# Altium footprint library Connector.PcbLib: 114 footprints (part 1 of 8)
Each footprint in its own frame and in the unit in brackets; x right, y up, seen from the top. Pads: shape width x height; smd on the part's side, far side on the other; paste and mask are expansions set on the pad; w line width, h text height; cw(c..) or ccw(c..) is an arc to the next point about the centre after c.
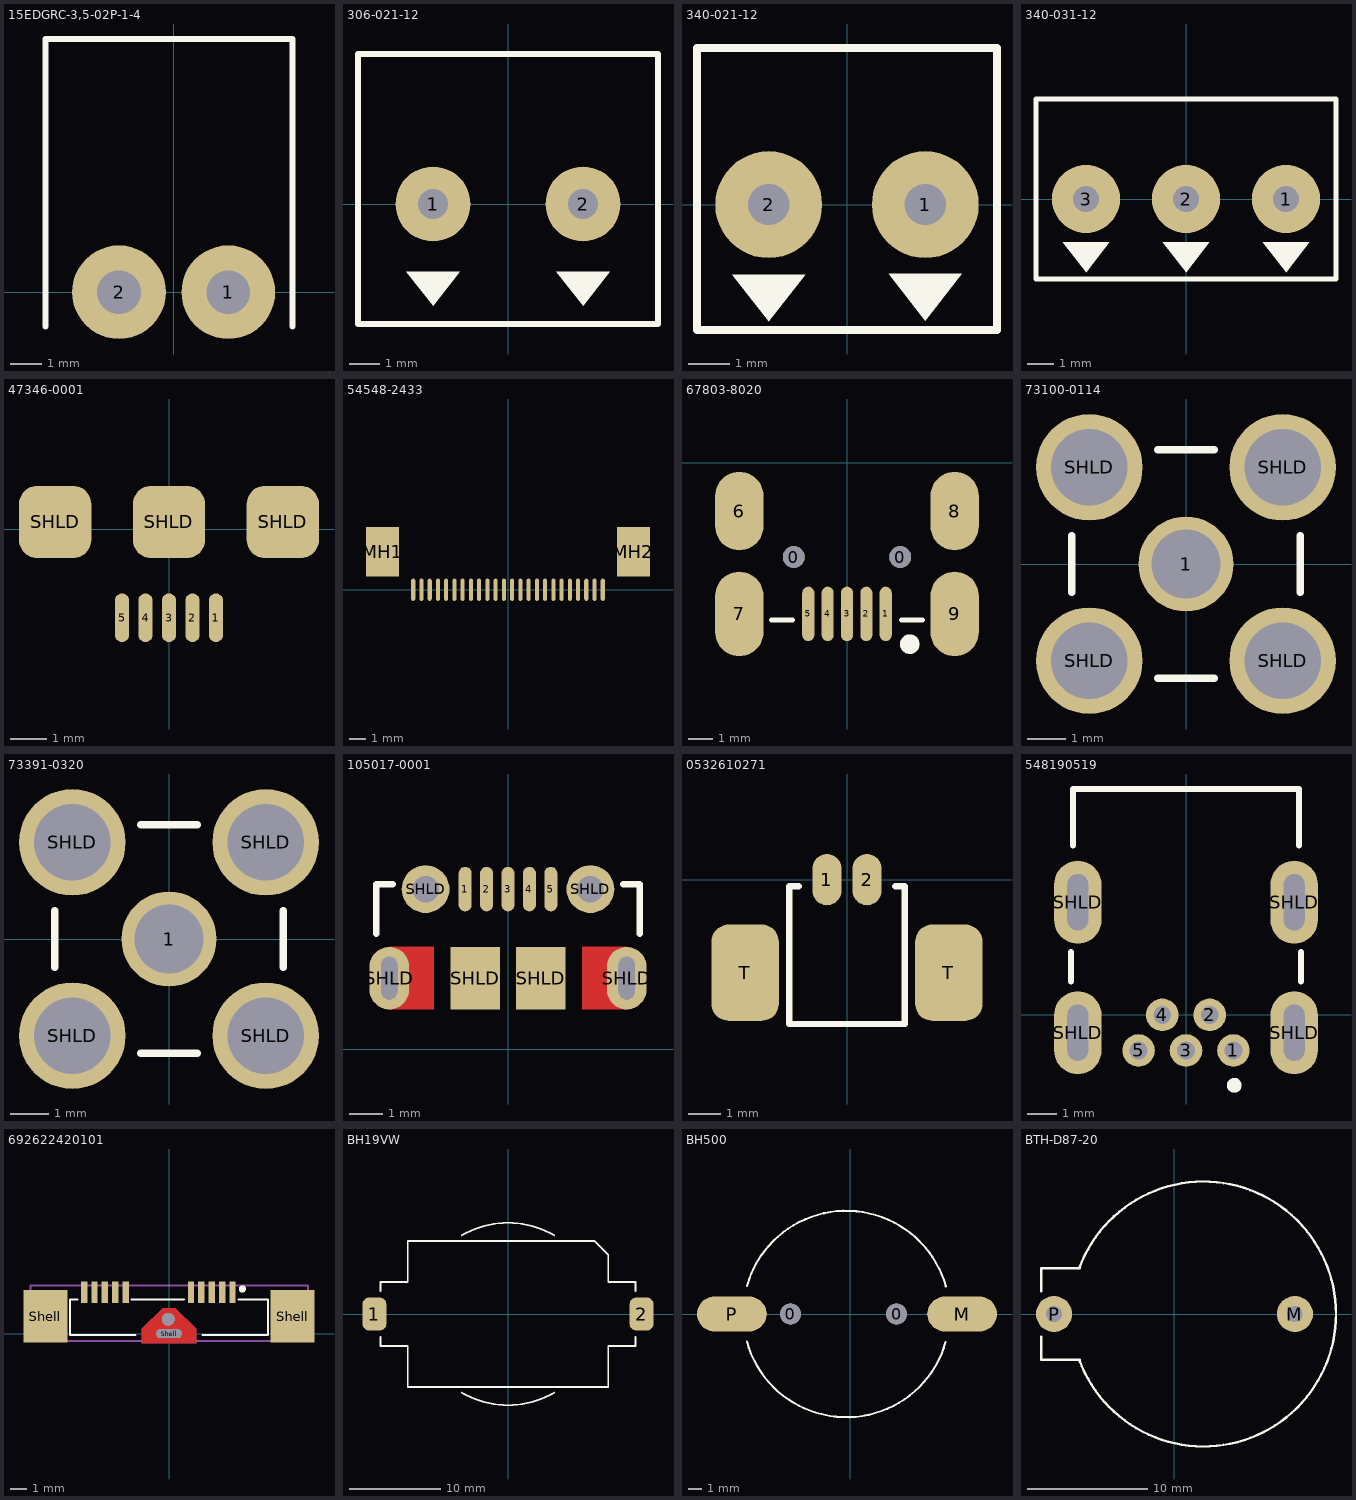
[diagram p0: the footprints below, top view; thin cyan lines are the x and y axes]

## 15EDGRC-3,5-02P-1-4 [mm]
pads (2):
  round 3 hole 1.4: 1(1.75,0) 2(-1.75,0)
Top Overlay:
  lines w0.2: -4.1,-1.1 -4.1,8.1 3.8,8.1 3.8,-1.1
3D body "15EDGRC-3_5-2.STEP": height 7.22, standoff -3.38, extent -3.9,-1.2 3.9,8

## 306-021-12 [mm]
pads (2):
  round 2.5 hole 1 unplated: 1(-2.5,0) 2(2.5,0)
Top Overlay:
  region: 3.389,-2.25 1.611,-2.25 2.5,-3.393
  region: -1.611,-2.25 -3.389,-2.25 -2.5,-3.393
  lines w0.2: -5,-4 5,-4 5,5 -5,5 -5,-4
3D body "DG300-5_0-02P-12.STEP": height 12.62, standoff -4.38, extent -5,-4 5,5

## 340-021-12 [mm]
pads (2):
  round 2.6 hole 1: 1(1.905,0) 2(-1.905,0)
Top Overlay:
  region: 2.795,-1.679 1.017,-1.679 1.906,-2.822
  region: -1.011,-1.7 -2.789,-1.7 -1.9,-2.843
  lines w0.2: -3.65,-3.048 -3.65,3.81 3.65,3.81 3.65,-3.048 -3.65,-3.048
3D body "DG340.STEP": height 8.51, standoff -3.49, extent -3.55,-3.1 3.55,3.9

## 340-031-12 [mm]
pads (3):
  round 2.6 hole 1: 1(3.81,0) 2(0,0) 3(-3.81,0)
Top Overlay:
  region: -2.921,-1.651 -4.699,-1.651 -3.81,-2.794
  region: 0.889,-1.651 -0.889,-1.651 0,-2.794
  region: 4.699,-1.651 2.921,-1.651 3.81,-2.794
  lines w0.2: -5.715,-3.048 5.715,-3.048 5.715,3.81 -5.715,3.81 -5.715,-3.048
3D body "DG340-031-12.STEP": height 8.52, standoff -3.48, extent -5.715,-3.1 5.715,3.9

## 47346-0001 [mm]
pads (8):
  oval 0.4x1.35 smd: 1(1.3,-2.45) 2(0.65,-2.45) 3(0,-2.45) 4(-0.65,-2.45) 5(-1.3,-2.45)
  rrect50% 2x2 smd: SHLD(-3.15,0.2) SHLD(0,0.2) SHLD(3.15,0.2)
Top Solder:
  rectangle: -1.3,-3 1.3,-1.9
3D body "473460001.stp": height 2.71, standoff -0.23, extent -3.99,-2.65 3.99,2.78

## 54548-2433 [mm]
pads (26):
  oval 0.25x1.35 smd: 1(-5.75,0) 2(-5.25,0) 3(-4.75,0) 4(-4.25,0) 5(-3.75,0) 6(-3.25,0) 7(-2.75,0) 8(-2.25,0) 9(-1.75,0) 10(-1.25,0) 11(-0.75,0) 12(-0.25,0) 13(0.25,0) 14(0.75,0) 15(1.25,0) 16(1.75,0) 17(2.25,0) 18(2.75,0) 19(3.25,0) 20(3.75,0) 21(4.25,0) 22(4.75,0) 23(5.25,0) 24(5.75,0)
  rect 2x3 smd: MH1(-7.6,2.3) MH2(7.6,2.3)
3D body "545482433.stp": height 1.21, standoff 0.01, extent -8.6,-0.05 8.6,4.95

## 67803-8020 [mm]
pads (11):
  round 0.9 hole 0.9 unplated: 0(-2.2,-3.9) 0(2.2,-3.9)
  oval 0.5x2.25 smd: 1(1.6,-6.25) 2(0.8,-6.25) 3(0,-6.25) 4(-0.8,-6.25) 5(-1.6,-6.25)
  oval 2x3.25 smd: 6(-4.45,-2) 8(4.45,-2)
  oval 2x3.5 smd: 7(-4.45,-6.25) 9(4.45,-6.25)
Top Overlay:
  circle w0.254: c2.595,-7.5 r0.28
  region: 2.625,-7.25 2.875,-7.5 2.625,-7.75 2.375,-7.5
  lines w0.2: -3.125,-6.5 -2.25,-6.5 ; 2.25,-6.5 3.125,-6.5
3D body "678038020.stp": height 4.02, standoff -0.93, extent -4.95,-7 4.95,2

## 73100-0114 [mm] "Connector; RF Coaxial, MCX, Thru-Hole; 5 Position; Right-Angle"
height 5.85
pads (5):
  round 2.5 hole 1.8: 1(0,0)
  round 2.8 hole 2: SHLD(-2.54,-2.54) SHLD(-2.54,2.54) SHLD(2.54,-2.54) SHLD(2.54,2.54)
Top Overlay:
  lines w0.2: -3,-0.74 -3,0.74 ; -0.74,-3 0.74,-3 ; -0.74,3 0.74,3 ; 3,-0.74 3,0.74
3D body "SMA-angled.STEP": height 9.91, standoff -3.89, extent -11,-3.5 3.5,3.5

## 73391-0320 [mm]
pads (5):
  round 2.5 hole 1.8: 1(0,0)
  round 2.8 hole 2: SHLD(-2.54,-2.54) SHLD(-2.54,2.54) SHLD(2.54,-2.54) SHLD(2.54,2.54)
Top Overlay:
  lines w0.2: -3,-0.74 -3,0.74 ; -0.74,-3 0.74,-3 ; -0.74,3 0.74,3 ; 3,-0.74 3,0.74
3D body "8006.stp": height 8.58, standoff -3.99, extent -11.8,-3.165 3.15,3.165

## 105017-0001 [mm] "105017-0001 Micro USB Connector (Molex)"
height 2
pads (11):
  oval 0.4x1.35 smd: 1(-1.3,4.85) 2(-0.65,4.85) 3(0,4.85) 4(0.65,4.85) 5(1.3,4.85)
  oval 1.2x1.9 hole 0.5 slot 1.3 at 90 deg: SHLD(-3.6,2.15) SHLD(3.6,2.15)
  round 1.45 hole 0.8: SHLD(-2.5,4.85) SHLD(2.5,4.85)
  rect 1.5x1.9 smd: SHLD(-1,2.15) SHLD(1,2.15)
Top Layer:
  region: -3.6,3.1 -2.25,3.1 -2.25,1.2 -3.6,1.2
  region: 2.25,3.1 3.6,3.1 3.6,1.2 2.25,1.2
Top Overlay:
  lines w0.2: -4,3.5 -4,5 -3.5,5 ; 3.5,5 4,5 4,3.5
Top Solder:
  rectangle: -1.3,4.3 1.3,5.4
  region: 2.15,3.2 3.6,3.2 3.6,1.1 2.15,1.1
  region: -3.6,3.2 -2.15,3.2 -2.15,1.1 -3.6,1.1
3D body "MicroUSB-B_Molex_105017-0001.STEP": height 2.72, standoff -0.58, extent -4.1,-0.4 4.1,5.03

## 0532610271 [mm]
pads (4):
  oval 0.9x1.6 smd mask+0.1: 1(-0.625,0) 2(0.625,0)
  rrect50% 2.1x3 smd mask+0.1: T(-3.175,-2.9) T(3.175,-2.9)
Top Overlay:
  lines w0.2: -1.5,-0.2 -1.8,-0.2 -1.8,-4.5 1.8,-4.5 1.8,-0.2 1.5,-0.2
3D body "FH02MR-SMT.STEP": height 3.52, standoff 0.02, extent -3.825,-4.8 3.825,0.4

## 548190519 [mm] "Connector; USB Mini-B, Type 2, Thru-Hole; 5 Position; Vertical"
height 7.7
pads (9):
  round 1.1 hole 0.6 mask+0.1: 1(1.6,-1.2) 2(0.8,0) 3(0,-1.2) 4(-0.8,0) 5(-1.6,-1.2)
  oval 1.6x2.8 hole 0.7 slot 1.9 at 90 deg mask+0.1: SHLD(-3.65,-0.6) SHLD(-3.65,3.8) SHLD(3.65,-0.6) SHLD(3.65,3.8)
Top Overlay:
  circle w0.25: c1.625,-2.375 r0.125
  lines w0.2: -3.875,1.125 -3.875,2.125 ; -3.81,5.715 -3.81,7.62 3.81,7.62 3.81,5.715 ; 3.875,1.125 3.875,2.125
3D body "548190519.stp": height 3.96, standoff -1.79, extent -3.85,-1.4 3.85,7.6

## 692622420101 [mm] "Micro Type B Vertical SMT - with Pads & positionning peg"
height 2.45
pads (14):
  rect 0.4x1.35 smd: 1(3.98,2.58) 2(3.33,2.58) 3(2.68,2.58) 4(2.03,2.58) 5(1.38,2.58) 6(-2.72,2.58) 7(-3.37,2.58) 8(-4.02,2.58) 9(-4.67,2.58) 10(-5.32,2.58)
  rect 2.75x3.3 smd: Shell(-7.75,1.08) Shell(7.75,1.08)
  round 0.8 hole 0.8: Shell(-0.05,0.9)
  oval 1.6x0.55 hole 0.55 slot 1.6 at 0 deg paste-99: Shell(0,0)
Top Layer:
  region: -1.7,-0.6 -1.7,0.3 -0.4,1.6 0.4,1.6 1.7,0.3 1.7,-0.6
Bottom Layer:
  region: -1.7,-0.6 -1.7,0.3 -0.4,1.6 0.4,1.6 1.7,0.3 1.7,-0.6
Top Overlay:
  circle w0.254: c4.6,2.8 r0.1
  lines w0.127: -5.75,2.15 -6.2,2.15 -6.2,0.875 -6.2,-0.1 -2.1,-0.1 ; -2.35,2.15 0.95,2.15 ; 2.1,-0.1 6.2,-0.1 6.2,2.15 4.35,2.15
Mechanical 13:
  lines w0.127: -8.675,-0.475 -8.675,3.025 8.725,3.025 8.725,-0.475 -8.675,-0.475
3D body "692622420101.stp": height 5.82, standoff -0.83, extent -8.725,-0.475 8.675,3.025

## BH19VW [mm] "CR2032 Connector"
pads (2):
  rrect50% 2.6x3.6 smd: 1(-14.65,0) 2(14.65,0)
Top Overlay:
  lines w0.2: -14,-2.5 -14,-3.5 -11,-3.5 -11,-8 11,-8 11,-3.5 14,-3.5 14,-2.5 ; -14,2.5 -14,3.5 -11,3.5 -11,8 9.5,8 11,6.5 11,3.5 14,3.5 14,2.5 ; -5.07,-8.619 ccw(c0,0) 5.07,-8.619 ; -5.07,8.619 cw(c0,0) 5.07,8.619
3D body "User Library-CR2032_Holder.STEP": height 5.61, standoff 0.01, extent -16.1,-8 16.1,8

## BH500 [mm]
pads (4):
  round 1.5 hole 1.5 unplated: 0(-4.3,0) 0(3.3,0)
  oval 5x2.5 smd: M(8,0) P(-8.5,0)
Top Overlay:
  lines w0.15: -7.43,-1.981 ccw(c-0.3,0) 6.823,-2.006 ; -7.423,2.006 cw(c-0.3,0) 6.83,1.981
3D body "User Library-Battery Holder for CR1220 SMD.step": height 4.26, standoff -0.49, extent -10.14,-7.374 8.661,7.374

## BTH-D87-20 [mm]
pads (2):
  round 3 hole 1.3 unplated: M(10,0) P(-10,0)
Top Overlay:
  lines w0.2: -11.049,-1.905 -11.049,-3.81 -7.874,-3.81 ; -11.049,1.905 -11.049,3.81 -7.874,3.81 ; -7.902,-3.82 ccw(c2.413,0) -7.902,3.82
3D body "CR2032_HOR_HOLD.STEP": height 8.51, standoff -3.99, extent -11.087,-11 13.413,11